# Altium footprint library Ixora.PcbLib: 191 footprints (part 12 of 12)
Each footprint in its own frame and in the unit in brackets; x right, y up, seen from the top. Pads: shape width x height; smd on the part's side, far side on the other; paste and mask are expansions set on the pad; w line width, h text height; cw(c..) or ccw(c..) is an arc to the next point about the centre after c.
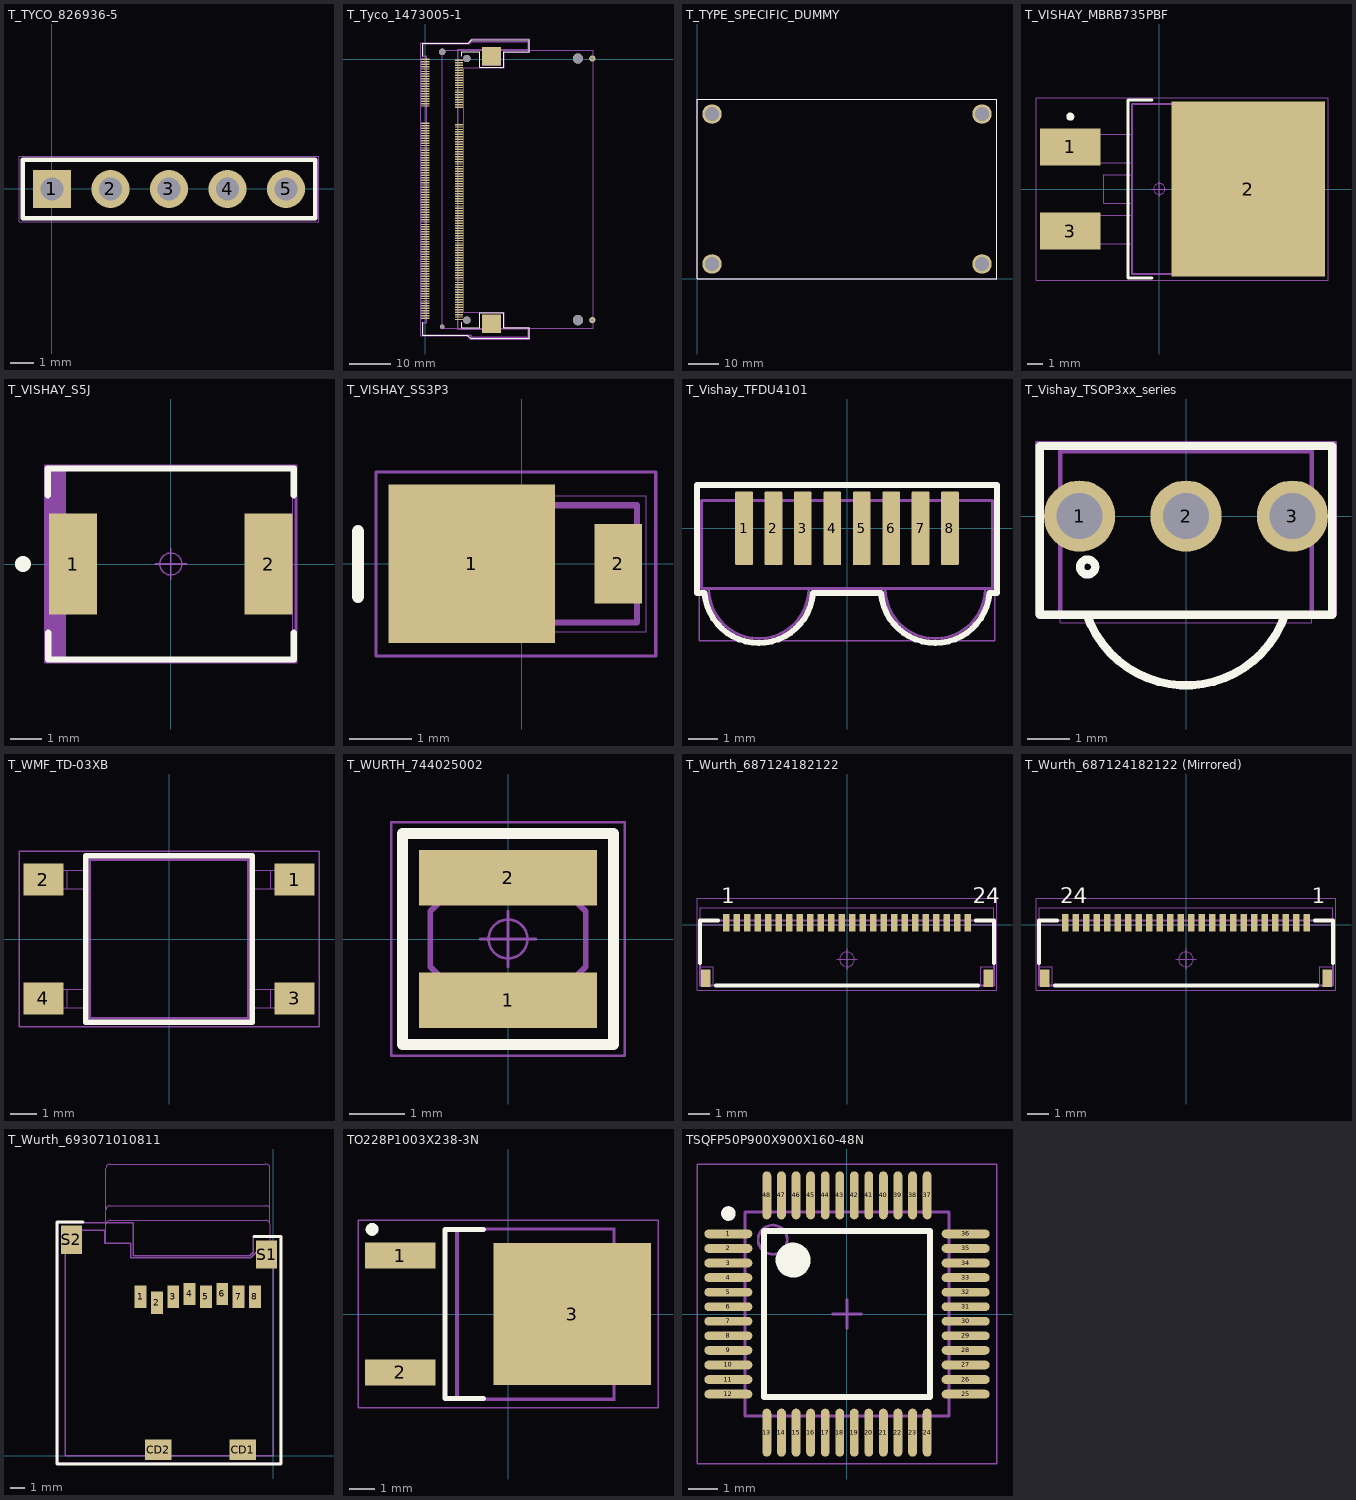
[diagram p11: the footprints below, top view; thin cyan lines are the x and y axes]

## T_TYCO_826936-5 [mm] "Connector, Header, 5 Position, 2.54mm pitch"
height 8.4
pads (5):
  rect 1.65x1.65 hole 1: 1(0,0)
  round 1.65 hole 1: 2(2.54,0) 3(5.08,0) 4(7.62,0) 5(10.16,0)
Top Overlay:
  lines w0.2: -1.27,-1.27 11.43,-1.27 11.43,1.27 -1.27,1.27 -1.27,-1.27
Mechanical 1:
  lines w0.05: -1.43,-1.43 11.59,-1.43 11.59,1.43 -1.43,1.43 -1.43,-1.43
Mechanical 2:
  lines w0.001: 11.43,-1.275 -1.27,-1.275 -1.27,1.27 11.43,1.27 11.43,-1.27
Mechanical 3:
  lines w0.1: 11.425,-1.27 -1.27,-1.27 -1.27,1.27 11.425,1.27 ; 11.43,-1.27 11.43,1.27

## T_Tyco_1473005-1 [mm] "SODIMM Connector"
height 5.2
pads (210):
  rect 2x0.35 smd: 1(0,0) 2(8.2,-0.3) 3(0,-0.6) 4(8.2,-0.9) 5(0,-1.2) 6(8.2,-1.5) 7(0,-1.8) 8(8.2,-2.1) 9(0,-2.4) 10(8.2,-2.7) 11(0,-3) 12(8.2,-3.3) 13(0,-3.6) 14(8.2,-3.9) 15(0,-4.2) 16(8.2,-4.5) 17(0,-4.8) 18(8.2,-5.1) 19(0,-5.4) 20(8.2,-5.7) 21(0,-6) 22(8.2,-6.3) 23(0,-6.6) 24(8.2,-6.9) 25(0,-7.2) 26(8.2,-7.5) 27(0,-7.8) 28(8.2,-8.1) 29(0,-8.4) 30(8.2,-8.7) 31(0,-9) 32(8.2,-9.3) 33(0,-9.6) 34(8.2,-9.9) 35(0,-10.2) 36(8.2,-10.5) 37(0,-10.8) 38(8.2,-11.1) 39(0,-11.4) 40(8.2,-11.7) 41(0,-15.6) 42(8.2,-15.9) 43(0,-16.2) 44(8.2,-16.5) 45(0,-16.8) 46(8.2,-17.1) 47(0,-17.4) 48(8.2,-17.7) 49(0,-18) 50(8.2,-18.3) 51(0,-18.6) 52(8.2,-18.9) 53(0,-19.2) 54(8.2,-19.5) 55(0,-19.8) 56(8.2,-20.1) 57(0,-20.4) 58(8.2,-20.7) 59(0,-21) 60(8.2,-21.3) 61(0,-21.6) 62(8.2,-21.9) 63(0,-22.2) 64(8.2,-22.5) 65(0,-22.8) 66(8.2,-23.1) 67(0,-23.4) 68(8.2,-23.7) 69(0,-24) 70(8.2,-24.3) 71(0,-24.6) 72(8.2,-24.9) 73(0,-25.2) 74(8.2,-25.5) 75(0,-25.8) 76(8.2,-26.1) 77(0,-26.4) 78(8.2,-26.7) 79(0,-27) 80(8.2,-27.3) 81(0,-27.6) 82(8.2,-27.9) 83(0,-28.2) 84(8.2,-28.5) 85(0,-28.8) 86(8.2,-29.1) 87(0,-29.4) 88(8.2,-29.7) 89(0,-30) 90(8.2,-30.3) 91(0,-30.6) 92(8.2,-30.9) 93(0,-31.2) 94(8.2,-31.5) 95(0,-31.8) 96(8.2,-32.1) 97(0,-32.4) 98(8.2,-32.7) 99(0,-33) 100(8.2,-33.3) 101(0,-33.6) 102(8.2,-33.9) 103(0,-34.2) 104(8.2,-34.5) 105(0,-34.8) 106(8.2,-35.1) 107(0,-35.4) 108(8.2,-35.7) 109(0,-36) 110(8.2,-36.3) 111(0,-36.6) 112(8.2,-36.9) 113(0,-37.2) 114(8.2,-37.5) 115(0,-37.8) 116(8.2,-38.1) 117(0,-38.4) 118(8.2,-38.7) 119(0,-39) 120(8.2,-39.3) 121(0,-39.6) 122(8.2,-39.9) 123(0,-40.2) 124(8.2,-40.5) 125(0,-40.8) 126(8.2,-41.1) 127(0,-41.4) 128(8.2,-41.7) 129(0,-42) 130(8.2,-42.3) 131(0,-42.6) 132(8.2,-42.9) 133(0,-43.2) 134(8.2,-43.5) 135(0,-43.8) 136(8.2,-44.1) 137(0,-44.4) 138(8.2,-44.7) 139(0,-45) 140(8.2,-45.3) 141(0,-45.6) 142(8.2,-45.9) 143(0,-46.2) 144(8.2,-46.5) 145(0,-46.8) 146(8.2,-47.1) 147(0,-47.4) 148(8.2,-47.7) 149(0,-48) 150(8.2,-48.3) 151(0,-48.6) 152(8.2,-48.9) 153(0,-49.2) 154(8.2,-49.5) 155(0,-49.8) 156(8.2,-50.1) 157(0,-50.4) 158(8.2,-50.7) 159(0,-51) 160(8.2,-51.3) 161(0,-51.6) 162(8.2,-51.9) 163(0,-52.2) 164(8.2,-52.5) 165(0,-52.8) 166(8.2,-53.1) 167(0,-53.4) 168(8.2,-53.7) 169(0,-54) 170(8.2,-54.3) 171(0,-54.6) 172(8.2,-54.9) 173(0,-55.2) 174(8.2,-55.5) 175(0,-55.8) 176(8.2,-56.1) 177(0,-56.4) 178(8.2,-56.7) 179(0,-57) 180(8.2,-57.3) 181(0,-57.6) 182(8.2,-57.9) 183(0,-58.2) 184(8.2,-58.5) 185(0,-58.8) 186(8.2,-59.1) 187(0,-59.4) 188(8.2,-59.7) 189(0,-60) 190(8.2,-60.3) 191(0,-60.6) 192(8.2,-60.9) 193(0,-61.2) 194(8.2,-61.5) 195(0,-61.8) 196(8.2,-62.1) 197(0,-62.4) 198(8.2,-62.7) 199(0,-63) 200(8.2,-63.3)
  round 1.1 hole 1.1 unplated: ""(4.1,-65.05)
  round 1.6 hole 1.6 unplated: ""(4.1,1.75)
  round 1.8 hole 1.8 unplated: ""(10.1,-63.45) ""(10.1,0.15)
  rect 4.6x4.5 smd: ""(16.1,-64.35) ""(16.1,0.75)
  round 2.5 hole 2.5 unplated: ""(37.1,-63.45) ""(37.1,0.15)
  round 1.5 hole 0.9: ""(40.6,-63.45) ""(40.6,0.15)
Top Overlay:
  lines w0.2: -0.635,-63.962 -0.635,-67.1 7,-67.1 ; -0.635,0.715 -0.635,3.881 6.969,3.881 6.97,3.88 10.48,3.88 11.35,4.75 25.273,4.75 25.273,1.85 19.05,1.85 19.05,-1.951 13.2,-1.951 13.2,1.75 8.9,1.75 8.9,0.715 ; 6.95,-67.1 10.25,-67.1 11.05,-67.9 25.273,-67.9 25.273,-65.35 ; 8.9,-65.3 13.208,-65.3 13.208,-61.641 19.05,-61.641 19.05,-65.35 25.2,-65.35 ; 8.9,-65.282 8.9,-63.962
Mechanical 1:
  lines w0.05: -1.141,-67.249 10.189,-67.249 10.983,-68.043 11.251,-68.043 25.413,-68.043 25.413,-65.211 19.191,-65.211 19.191,-61.502 9.374,-61.502 9.374,-2.1 19.2,-2.1 19.2,1.705 25.42,1.705 25.42,4.897 11.289,4.897 10.42,4.028 -1.141,4.028 -1.141,-67.249
Mechanical 2:
  lines w0.001: -0.635,-67.102 6.223,-67.102 10.795,-67.102 11.303,-67.61 25.146,-67.61 25.146,-65.451 18.288,-65.451 18.288,-62.276 13.97,-62.276 13.97,-65.451 8.001,-65.451 8.001,2.24 13.97,2.24 13.97,-1.443 18.288,-1.443 18.288,2.24 25.146,2.24 25.146,4.399 11.303,4.399 10.795,3.891 6.223,3.891 -0.635,3.891 -0.635,0.716 0.254,0.716 0.254,-63.962 -0.635,-63.962 -0.635,-67.102 ; 4.1,-65.45 40.8,-65.45 40.8,2.15 4.1,2.15 4.1,-65.45
Mechanical 3:
  lines w0.1: -0.508,-66.975 5.969,-66.975 10.922,-66.975 11.43,-67.483 25.019,-67.483 25.019,-65.578 18.161,-65.578 18.161,-62.403 14.097,-62.403 14.097,-65.705 7.874,-65.705 7.874,2.367 14.097,2.367 14.097,-1.189 18.161,-1.189 18.161,2.367 25.019,2.367 25.019,4.272 11.303,4.272 10.795,3.764 5.969,3.764 -0.508,3.764 -0.508,0.843 0.381,0.843 0.381,-64.054 -0.508,-64.054 -0.508,-66.975
3D body: height 5.22, standoff -0.68, extent -0.9,-67.4 25.15,4.1

## T_TYPE_SPECIFIC_DUMMY [mm] "DUMMY TYPE SPECIFIC"
pads (4):
  round 6.5 hole 4.7: ""(5,5) ""(5,55) ""(95,5) ""(95,55)
Top Overlay:
  lines w0.2: 0,0 100,0 100,60 0,60 0,0
Mechanical 2:
  lines w0.01: 0,0 0,60 100,60 100,0 0,0
3D body: height 8, standoff 0, extent 3.257,3.253 6.743,6.747
3D body: height 8, standoff 0, extent 2.261,2.255 7.739,7.745
3D body: height 8, standoff 0, extent 92.261,2.255 97.739,7.745
3D body: height 8, standoff 0, extent 93.257,3.253 96.743,6.747
3D body: height 8, standoff 0, extent 92.261,52.255 97.739,57.745
3D body: height 8, standoff 0, extent 93.257,53.253 96.743,56.747
3D body: height 8, standoff 0, extent 2.261,52.255 7.739,57.745
3D body: height 8, standoff 0, extent 3.257,53.253 6.743,56.747

## T_VISHAY_MBRB735PBF [mm]
height 4.83
pads (3):
  rect 3.81x2.32 smd: 1(-5.585,2.64) 3(-5.585,-2.64)
  rect 9.65x11 smd: 2(5.585,0)
Top Overlay:
  circle w0.25: c-5.585,4.54 r0.125
  lines w0.2: -0.465,-5.585 -1.965,-5.585 -1.965,5.585 -0.465,5.585
Mechanical 1:
  circle w0.05: c0,0 r0.35
  lines w0.05: -0.5,0 0.5,0 ; 0,-0.5 0,0.5 ; -7.735,-5.72 10.605,-5.72 10.605,5.72 -7.735,5.72 -7.735,-5.72
Mechanical 2:
  lines w0.001: -1.715,-3.43 -6.295,-3.43 -6.295,-1.65 -1.715,-1.65 ; -1.715,-0.89 -3.495,-0.89 -3.495,0.89 -1.715,0.89 ; -1.715,1.65 -6.295,1.65 -6.295,3.43 -1.715,3.43 ; 7.935,-5.335 7.935,5.335 ; -1.715,-5.335 8.74,-5.335 9.585,-4.49 9.585,4.49 8.74,5.335 -1.715,5.335 -1.715,-5.335
Mechanical 3:
  lines w0.1: 7.935,-5.335 8.74,-5.335 9.585,-4.49 9.585,4.49 8.74,5.335 7.935,5.335 ; 7.935,-5.335 7.935,5.335 ; 7.935,-5.335 -1.715,-5.335 -1.715,5.335 7.935,5.335
3D body: height 3.56, standoff 3.03, extent -3.495,-0.89 -1.715,0.89
3D body: height 0.53, standoff 0, extent -6.295,-3.43 -4.105,-1.65
3D body: height 0.53, standoff 0, extent -6.295,1.65 -4.105,3.43
3D body: height 1.4, standoff 0, extent 7.935,-5.335 9.585,5.335
3D body: height 4.83, standoff 0, extent -1.715,-5.335 7.935,5.335
3D body: height 3.56, standoff 0, extent -4.105,-3.43 -3.5,-1.65
3D body: height 3.56, standoff 0, extent -4.105,1.65 -3.5,3.43
3D body: height 3.56, standoff 3.03, extent -3.5,1.65 -1.715,3.43
3D body: height 3.56, standoff 3.03, extent -3.5,-3.43 -1.715,-1.65

## T_VISHAY_S5J [mm] "5A Rectifier"
height 2.62
pads (2):
  rect 1.52x3.2 smd: 1(-3.105,0) 2(3.105,0)
Top Overlay:
  circle w0.25: c-4.697,0 r0.125
  lines w0.2: -3.906,2.187 -3.906,3.032 3.902,3.032 3.902,2.187 ; -3.893,-2.187 -3.893,-3.032 3.902,-3.032 3.902,-2.187
Mechanical 1:
  circle w0.05: c0,0 r0.35
  lines w0.05: -0.5,0 0.5,0 ; 0,-0.5 0,0.5 ; -4.001,-3.141 4.001,-3.141 4.001,3.141 -4.001,3.141 -4.001,-3.141
Mechanical 2:
  lines w0.001: -3.875,-3.11 3.875,-3.11 3.875,3.11 -3.875,3.11 -3.875,-3.11
Mechanical 3:
  lines w0.1: -3.879,-3.032 -3.879,3.032 ; -3.777,-3.032 -3.777,3.032 ; -3.676,-3.032 -3.676,3.032 ; -3.575,-3.032 -3.575,3.032 ; -3.474,-3.032 -3.474,3.032 ; -3.373,-3.032 -3.373,3.032 ; -3.929,-3.032 3.978,-3.032 3.978,3.032 -3.929,3.032 -3.929,-3.032

## T_VISHAY_SS3P3 [mm] "Schottky Barrier Rectifiers. 2-Leads, Body 3.7x1.88mm"
height 1.15
pads (2):
  rect 2.67x2.54 smd: 1(-0.8,0)
  rect 0.762x1.27 smd: 2(1.551,0)
Top Overlay:
  lines w0.2: -2.628,-0.529 -2.628,0.521
Mechanical 1:
  lines w0.05: -2.339,-1.482 2.15,-1.482 2.15,1.476 -2.339,1.476 -2.339,-1.482
Mechanical 2:
  lines w0.001: -1.7,-1.09 -1.7,1.09 ; -1.3,-1.09 -1.3,1.09 ; -2,-1.09 2,-1.09 2,1.09 -2,1.09 -2,-1.09
Mechanical 3:
  rectangle: -1.9,-0.94 -1.443,0.94
  lines w0.1: -1.85,-0.94 1.85,-0.94 1.85,0.94 -1.85,0.94 ; -1.7,-0.9 -1.7,0.9
3D body: height 1.15, standoff 0, extent -1.7,-1.09 -1.3,1.09
3D body: height 0.35, standoff 0, extent -2,-0.675 -1.7,0.675
3D body: height 1.15, standoff 0, extent -1.3,-1.09 -0.84,1.09
3D body: height 1.15, standoff 0, extent -0.84,-1.09 1.55,1.09
3D body: height 0.35, standoff 0, extent 1.55,-0.455 2,0.455

## T_Vishay_TFDU4101 [mm] "Infrared Transceiver Module"
height 4
pads (8):
  rrect12% 0.6x2.5 smd: 1(-3.5,0) 2(-2.5,0) 3(-1.5,0) 4(-0.5,0) 5(0.5,0) 6(1.5,0) 7(2.5,0) 8(3.5,0)
Top Overlay:
  lines w0.2: -4.85,-2.2 -5.1,-2.2 -5.1,1.475 5.1,1.475 5.1,-2.2 4.85,-2.2 ; -4.844,-2.2 ccw(c-3,-2.05) -1.156,-2.2 ; -1.15,-2.2 1.15,-2.2 ; 1.156,-2.2 ccw(c3,-2.05) 4.844,-2.2
Mechanical 1:
  lines w0.05: -5.025,-3.825 -5.025,1.4 5.025,1.4 5.025,-3.825 -5.025,-3.825
Mechanical 2:
  lines w0.001: -4.7,-2.05 ccw(c-3,-2.05) -1.3,-2.05 ; 1.3,-2.05 ccw(c3,-2.05) 4.7,-2.05 ; -4.95,-2.05 4.95,-2.05 4.95,0.95 -4.95,0.95 -4.95,-2.05
Mechanical 3:
  lines w0.1: -4.7,-2.05 ccw(c-3,-2.05) -1.3,-2.05 ; 1.3,-2.05 ccw(c3,-2.05) 4.7,-2.05 ; -4.95,-2.05 -4.95,0.95 4.95,0.95 4.95,-2.05 -4.95,-2.05
3D body: height 4.32, standoff 0.02, extent -4.956,-3.941 4.95,1.367

## T_Vishay_TSOP3xx_series [mm] "IR Receiver Module for Remote Control Systems"
height 10.25
pads (3):
  round 1.7 hole 1.1: 1(-2.54,0) 2(0,0) 3(2.54,0)
Top Overlay:
  circle w0.2: c-2.348,-1.213 r0.178
  lines w0.2: -2.366,-2.35 ccw(c-0.001,-1.54) 2.365,-2.348 ; -3.49,-2.35 3.49,-2.35 3.49,1.675 -3.49,1.675 -3.49,-2.35
Mechanical 1:
  lines w0.05: -3.58,-2.35 -3.58,1.765 3.58,1.765 3.58,-2.35 -3.58,-2.35
Mechanical 2:
  lines w0.01: -2.369,-2.35 ccw(c0,-1.55) 2.369,-2.35 ; -3,-2.35 -3,-2.55 3,-2.55 3,-2.35 ; -3,-2.35 -3,1.55 3,1.55 3,-2.35 ; -3,-2.35 3,-2.35
Mechanical 3:
  circle w0.1: c-2.348,-1.213 r0.215
  lines w0.1: -2.369,-2.35 ccw(c0,-1.55) 2.369,-2.35 ; -3,-2.35 3,-2.35 3,1.55 -3,1.55 -3,-2.35
3D body: height 1.65, standoff 0, extent -3,-2.55 3,-2.35
3D body: height 6.75, standoff 1.75, extent -2.487,-4.05 2.487,0.929
3D body: height 6.96, standoff 0, extent -3,-2.35 3,1.55
3D body: height 0, standoff -23.55, extent 2.19,-0.25 2.89,0.25
3D body: height 0, standoff -23.55, extent -0.35,-0.25 0.35,0.25
3D body: height 0, standoff -23.55, extent -2.89,-0.25 -2.19,0.25

## T_WMF_TD-03XB [mm] "Push Button"
height 7.8
pads (4):
  rect 1.5x1.2 smd: 1(4.75,2.25) 2(-4.75,2.25) 3(4.75,-2.25) 4(-4.75,-2.25)
Top Overlay:
  lines w0.2: -3.15,-3.15 3.15,-3.15 3.15,3.15 -3.15,3.15 -3.15,-3.15
Mechanical 1:
  lines w0.05: -5.675,-3.321 5.675,-3.321 5.675,3.321 -5.675,3.321 -5.675,-3.321
Mechanical 2:
  lines w0.001: -4.05,-2.6 -4.05,-1.9 ; -4.05,1.9 -4.05,2.6 ; -3.85,-2.6 -3.85,-1.9 ; -3.85,1.9 -3.85,2.6 ; -3,-2.6 -5.15,-2.6 -5.15,-1.9 -3,-1.9 ; -3,1.9 -5.15,1.9 -5.15,2.6 -3,2.6 ; 3,-2.6 5.15,-2.6 5.15,-1.9 3,-1.9 ; 3,1.9 5.15,1.9 5.15,2.6 3,2.6 ; 3.85,-2.6 3.85,-1.9 ; 3.85,1.9 3.85,2.6 ; 4.05,-2.6 4.05,-1.9 ; 4.05,1.9 4.05,2.6 ; -3,-3 3,-3 3,3 -3,3 -3,-3
Mechanical 3:
  lines w0.1: -3,-3 3,-3 3,3 -3,3 -3,-3
3D body: height 3.5, standoff 3.49, extent -3,-3 3,3
3D body: height 7.8, standoff 3.5, extent -1.736,-1.747 1.75,1.747
3D body: height 3.49, standoff 0, extent -3,-3 3,3
3D body: height 3.7, standoff 3.5, extent 1.754,1.751 2.75,2.749
3D body: height 3.7, standoff 3.5, extent -2.746,1.751 -1.75,2.749
3D body: height 3.7, standoff 3.5, extent -2.746,-2.749 -1.75,-1.751
3D body: height 3.7, standoff 3.5, extent 1.754,-2.749 2.75,-1.751
3D body: height 0.2, standoff 0, extent -5.15,1.9 -4.05,2.6
3D body: height 0.2, standoff 0, extent -5.15,-2.6 -4.05,-1.9
3D body: height 0.2, standoff 0, extent 4.05,-2.6 5.15,-1.9
3D body: height 0.2, standoff 0, extent 4.05,1.9 5.15,2.6
3D body: height 1, standoff 0, extent 3.85,1.9 4.05,2.6
3D body: height 1, standoff 0, extent 3.85,-2.6 4.05,-1.9
3D body: height 1, standoff 0, extent -4.05,-2.6 -3.85,-1.9
3D body: height 1, standoff 0, extent -4.05,1.9 -3.85,2.6
3D body: height 1, standoff 0.8, extent -3.85,1.9 -3,2.6
3D body: height 1, standoff 0.8, extent -3.85,-2.6 -3,-1.9
3D body: height 1, standoff 0.8, extent 3,-2.6 3.85,-1.9
3D body: height 1, standoff 0.8, extent 3,1.9 3.85,2.6

## T_WURTH_744025002 [mm] "POWER-CHOKE"
height 2.8
pads (2):
  rect 3.2x1 smd: 1(0,-1.1) 2(0,1.1)
Top Overlay:
  lines w0.2: -1.9,-1.9 1.9,-1.9 1.9,1.9 -1.9,1.9 -1.9,-1.9
Mechanical 1:
  lines w0.05: -2.1,-2.1 -2.1,2.1 2.1,2.1 2.1,-2.1 -2.1,-2.1
Mechanical 2:
  lines w0.01: -1.4,-0.5 -1.4,0.5 -0.5,1.4 0.5,1.4 1.4,0.5 1.4,-0.5 0.5,-1.4 -0.5,-1.4 -1.4,-0.5
Mechanical 3:
  circle w0.05: c0,0 r0.35
  lines w0.05: -0.5,0 0.5,0 ; 0,-0.5 0,0.5
  lines w0.1: -1.4,-0.5 -1.4,0.5 -0.5,1.4 0.5,1.4 1.4,0.5 1.4,-0.5 0.5,-1.4 -0.5,-1.4 -1.4,-0.5
3D body: height 2.81, standoff 0, extent -0.996,-1 0.996,0.996
3D body: height 2.8, standoff 0, extent -1.4,-1.4 1.4,1.4

## T_Wurth_687124182122 [mm] "FPC Connector, 24 Position, Top and Bottom 0.020\" (0.50mm) Surface Mount, Right Angle"
height 0.96
pads (26):
  rect 0.3x0.85 smd: 1(-5.75,0.095) 2(-5.25,0.095) 3(-4.75,0.095) 4(-4.25,0.095) 5(-3.75,0.095) 6(-3.25,0.095) 7(-2.75,0.095) 8(-2.25,0.095) 9(-1.75,0.095) 10(-1.25,0.095) 11(-0.75,0.095) 12(-0.25,0.095) 13(0.25,0.095) 14(0.75,0.095) 15(1.25,0.095) 16(1.75,0.095) 17(2.25,0.095) 18(2.75,0.095) 19(3.25,0.095) 20(3.75,0.095) 21(4.25,0.095) 22(4.75,0.095) 23(5.25,0.095) 24(5.75,0.095)
  rect 0.45x0.85 smd: ""(-6.725,-2.55) ""(6.725,-2.55)
Top Overlay:
  lines w0.2: -7,-1.822 -7,0.2 -6.147,0.2 ; -6.25,-2.9 6.25,-2.9 ; 6.147,0.2 7,0.2 7,-1.822
  text "24" at 6,1.016 h0.75
  text "1" at -6,1.016 h0.75
Mechanical 1:
  circle w0.05: c0,-1.651 r0.35
  lines w0.05: -0.5,-1.651 0.5,-1.651 ; 0,-2.151 0,-1.151 ; -7.137,-3.124 -7.137,1.27 7.137,1.27 7.137,-3.124 -7.137,-3.124
Mechanical 2:
  lines w0.001: -7,-2.9 7,-2.9 7,0 -7,0
  lines w0.005: -7,-2 -6.375,-2 -6.375,-2.9 ; -7,0 7,0 ; -7,0.2 7,0.2 ; 6.375,-2.9 6.375,-2 7,-2 ; -7,-2.9 7,-2.9 7,0.8 -7,0.8 -7,-2.9
Mechanical 3:
  lines w0.1: -7,-2.896 -7,0.2 7,0.2 7,-2.896 -7,-2.896
3D body: height 0.98, standoff -0.01, extent -7,-2.9 7,0.6

## T_Wurth_687124182122 (Mirrored) [mm] "FPC Connector(Mirrored), 24 Position, Top and Bottom 0.020\" (0.50mm) Surface Mount, Right Angle"
height 0.96
pads (26):
  rect 0.3x0.85 smd: 1(5.75,0.095) 2(5.25,0.095) 3(4.75,0.095) 4(4.25,0.095) 5(3.75,0.095) 6(3.25,0.095) 7(2.75,0.095) 8(2.25,0.095) 9(1.75,0.095) 10(1.25,0.095) 11(0.75,0.095) 12(0.25,0.095) 13(-0.25,0.095) 14(-0.75,0.095) 15(-1.25,0.095) 16(-1.75,0.095) 17(-2.25,0.095) 18(-2.75,0.095) 19(-3.25,0.095) 20(-3.75,0.095) 21(-4.25,0.095) 22(-4.75,0.095) 23(-5.25,0.095) 24(-5.75,0.095)
  rect 0.45x0.85 smd: ""(-6.725,-2.55) ""(6.725,-2.55)
Top Overlay:
  lines w0.2: -7,-1.822 -7,0.2 -6.147,0.2 ; -6.25,-2.9 6.25,-2.9 ; 6.147,0.2 7,0.2 7,-1.822
  text "24" at -6,1.016 h0.75
  text "1" at 6,1.016 h0.75
Mechanical 1:
  circle w0.05: c0,-1.651 r0.35
  lines w0.05: -0.5,-1.651 0.5,-1.651 ; 0,-2.151 0,-1.151 ; -7.137,-3.124 -7.137,1.27 7.137,1.27 7.137,-3.124 -7.137,-3.124
Mechanical 2:
  lines w0.001: -7,-2.9 7,-2.9 7,0 -7,0
  lines w0.005: -7,-2 -6.375,-2 -6.375,-2.9 ; -7,0 7,0 ; -7,0.2 7,0.2 ; 6.375,-2.9 6.375,-2 7,-2 ; -7,-2.9 7,-2.9 7,0.8 -7,0.8 -7,-2.9
Mechanical 3:
  lines w0.1: -7,-2.896 -7,0.2 7,0.2 7,-2.896 -7,-2.896
3D body: height 0.98, standoff -0.01, extent -7,-2.9 7,0.6

## T_Wurth_693071010811 [mm] "MicroSD Holder, Push-Pust Type,"
height 1.98
pads (12):
  rect 0.8x1.5 smd: 1(-8.94,10.7) 2(-7.84,10.3) 3(-6.74,10.7) 4(-5.64,10.9) 5(-4.54,10.7) 6(-3.44,10.9) 7(-2.34,10.7) 8(-1.24,10.7)
  rect 1.8x1.4 smd: CD1(-2.05,0.4) CD2(-7.75,0.4)
  rect 1.4x1.9 smd: S1(-0.45,13.55) S2(-13.6,14.55)
Top Overlay:
  lines w0.2: -12.802,15.748 -14.554,15.748 -14.554,-0.559 0.508,-0.559 0.508,14.757 -1.295,14.757
Mechanical 1:
  lines w0.1: -14.503,-0.508 -14.503,15.697 -9.423,15.697 -9.423,13.462 -1.575,13.462 -1.346,13.691 -1.346,14.707 0.457,14.707 0.457,-0.508 -14.503,-0.508
Mechanical 2:
  lines w0.01: -11.27,14.326 -11.27,15.575 ; -11.27,16.575 cw(c-10.995,16.575) -10.995,16.85 -0.495,16.85 cw(c-0.495,16.575) -0.22,16.575 ; -0.22,14.2 -0.22,15.575 ccw(c-0.495,15.575) -0.495,15.85 -10.995,15.85 ccw(c-10.995,15.575) -11.27,15.575 ; -0.22,15.578 -0.22,19.375 ccw(c-0.495,19.375) -0.495,19.65 -10.995,19.65 ccw(c-10.995,19.375) -11.27,19.375 -11.27,15.575 ; -14,0 -14,15.2 -11.354,15.2 -11.354,14.326 -9.601,14.326 -9.601,13.335 -1.524,13.335 -0.659,14.2 0,14.2 0,0 -14,0
Mechanical 3:
  lines w0.1: -14,0 -14,15.2 -11.354,15.2 -11.354,14.326 -9.601,14.326 -9.601,13.335 -1.524,13.335 -0.659,14.2 0,14.2 0,0 -14,0
3D body: height 1.83, standoff -0.07, extent -14,0 0,15.2
3D body: height 1.8, standoff 0.69, extent -11.269,4.623 -0.22,19.65

## TO228P1003X238-3N [mm]
pads (3):
  rect 2.75x1 smd: 1(-4.2,2.28) 2(-4.2,-2.28)
  rect 6.15x5.55 smd: 3(2.5,0)
Top Overlay:
  circle w0.25: c-5.3,3.3 r0.125
  lines w0.2: -0.95,-3.3 -2.45,-3.3 -2.45,3.3 -0.95,3.3
Top Paste:
  region: 2.86,0.36 4.86,0.36 4.86,2.06 2.86,2.06
  region: 0.14,0.36 2.14,0.36 2.14,2.06 0.14,2.06
  region: 2.86,-2.06 4.86,-2.06 4.86,-0.36 2.86,-0.36
  region: 0.14,-2.06 2.14,-2.06 2.14,-0.36 0.14,-0.36
Mechanical 1:
  circle w0.05: c0,0 r0.35
  lines w0.05: -0.5,0 0.5,0 ; 0,-0.5 0,0.5 ; -5.85,-3.65 -5.85,3.65 5.85,3.65 5.85,-3.65 -5.85,-3.65
Mechanical 2:
  lines w0.001: -2.032,-3.365 -2.032,3.365 4.188,3.365 4.188,-3.365 -2.032,-3.365
Mechanical 3:
  lines w0.1: 4.125,-2.668 4.419,-2.668 5.015,-2.006 5.015,2.006 4.419,2.668 4.125,2.668 ; -1.97,-3.302 -1.97,3.302 4.125,3.302 4.125,-3.302 -1.97,-3.302

## TSQFP50P900X900X160-48N [mm]
pads (48):
  oval 1.65x0.3 smd: 1(-4.075,2.75) 2(-4.075,2.25) 3(-4.075,1.75) 4(-4.075,1.25) 5(-4.075,0.75) 6(-4.075,0.25) 7(-4.075,-0.25) 8(-4.075,-0.75) 9(-4.075,-1.25) 10(-4.075,-1.75) 11(-4.075,-2.25) 12(-4.075,-2.75) 25(4.075,-2.75) 26(4.075,-2.25) 27(4.075,-1.75) 28(4.075,-1.25) 29(4.075,-0.75) 30(4.075,-0.25) 31(4.075,0.25) 32(4.075,0.75) 33(4.075,1.25) 34(4.075,1.75) 35(4.075,2.25) 36(4.075,2.75)
  oval 0.3x1.65 smd: 13(-2.75,-4.075) 14(-2.25,-4.075) 15(-1.75,-4.075) 16(-1.25,-4.075) 17(-0.75,-4.075) 18(-0.25,-4.075) 19(0.25,-4.075) 20(0.75,-4.075) 21(1.25,-4.075) 22(1.75,-4.075) 23(2.25,-4.075) 24(2.75,-4.075) 37(2.75,4.075) 38(2.25,4.075) 39(1.75,4.075) 40(1.25,4.075) 41(0.75,4.075) 42(0.25,4.075) 43(-0.25,4.075) 44(-0.75,4.075) 45(-1.25,4.075) 46(-1.75,4.075) 47(-2.25,4.075) 48(-2.75,4.075)
Top Overlay:
  circle w0.25: c-4.075,3.45 r0.125
  circle w0.6: c-1.85,1.85 r0.3
  lines w0.2: -2.85,-2.85 -2.85,2.85 2.85,2.85 2.85,-2.85 -2.85,-2.85
Mechanical 1:
  lines w0.05: -5.15,-5.15 -5.15,5.15 5.15,5.15 5.15,-5.15 -5.15,-5.15
Mechanical 2:
  lines w0.01: -3.5,-3.5 3.5,-3.5 3.5,3.5 -3.5,3.5 -3.5,-3.5
Mechanical 3:
  circle w0.1: c-2.55,2.55 r0.5
  lines w0.1: -0.5,0 0.5,0 ; 0,-0.5 0,0.5 ; -3.5,-3.5 3.5,-3.5 3.5,3.5 -3.5,3.5 -3.5,-3.5
3D body: height 1.6, standoff 0.25, extent -3.5,-3.5 3.5,3.5